# Altium footprint library mobinbyn-Capacitor.PcbLib: 152 footprints (part 6 of 10)
Each footprint in its own frame and in the unit in brackets; x right, y up, seen from the top. Pads: shape width x height; smd on the part's side, far side on the other; paste and mask are expansions set on the pad; w line width, h text height; cw(c..) or ccw(c..) is an arc to the next point about the centre after c.
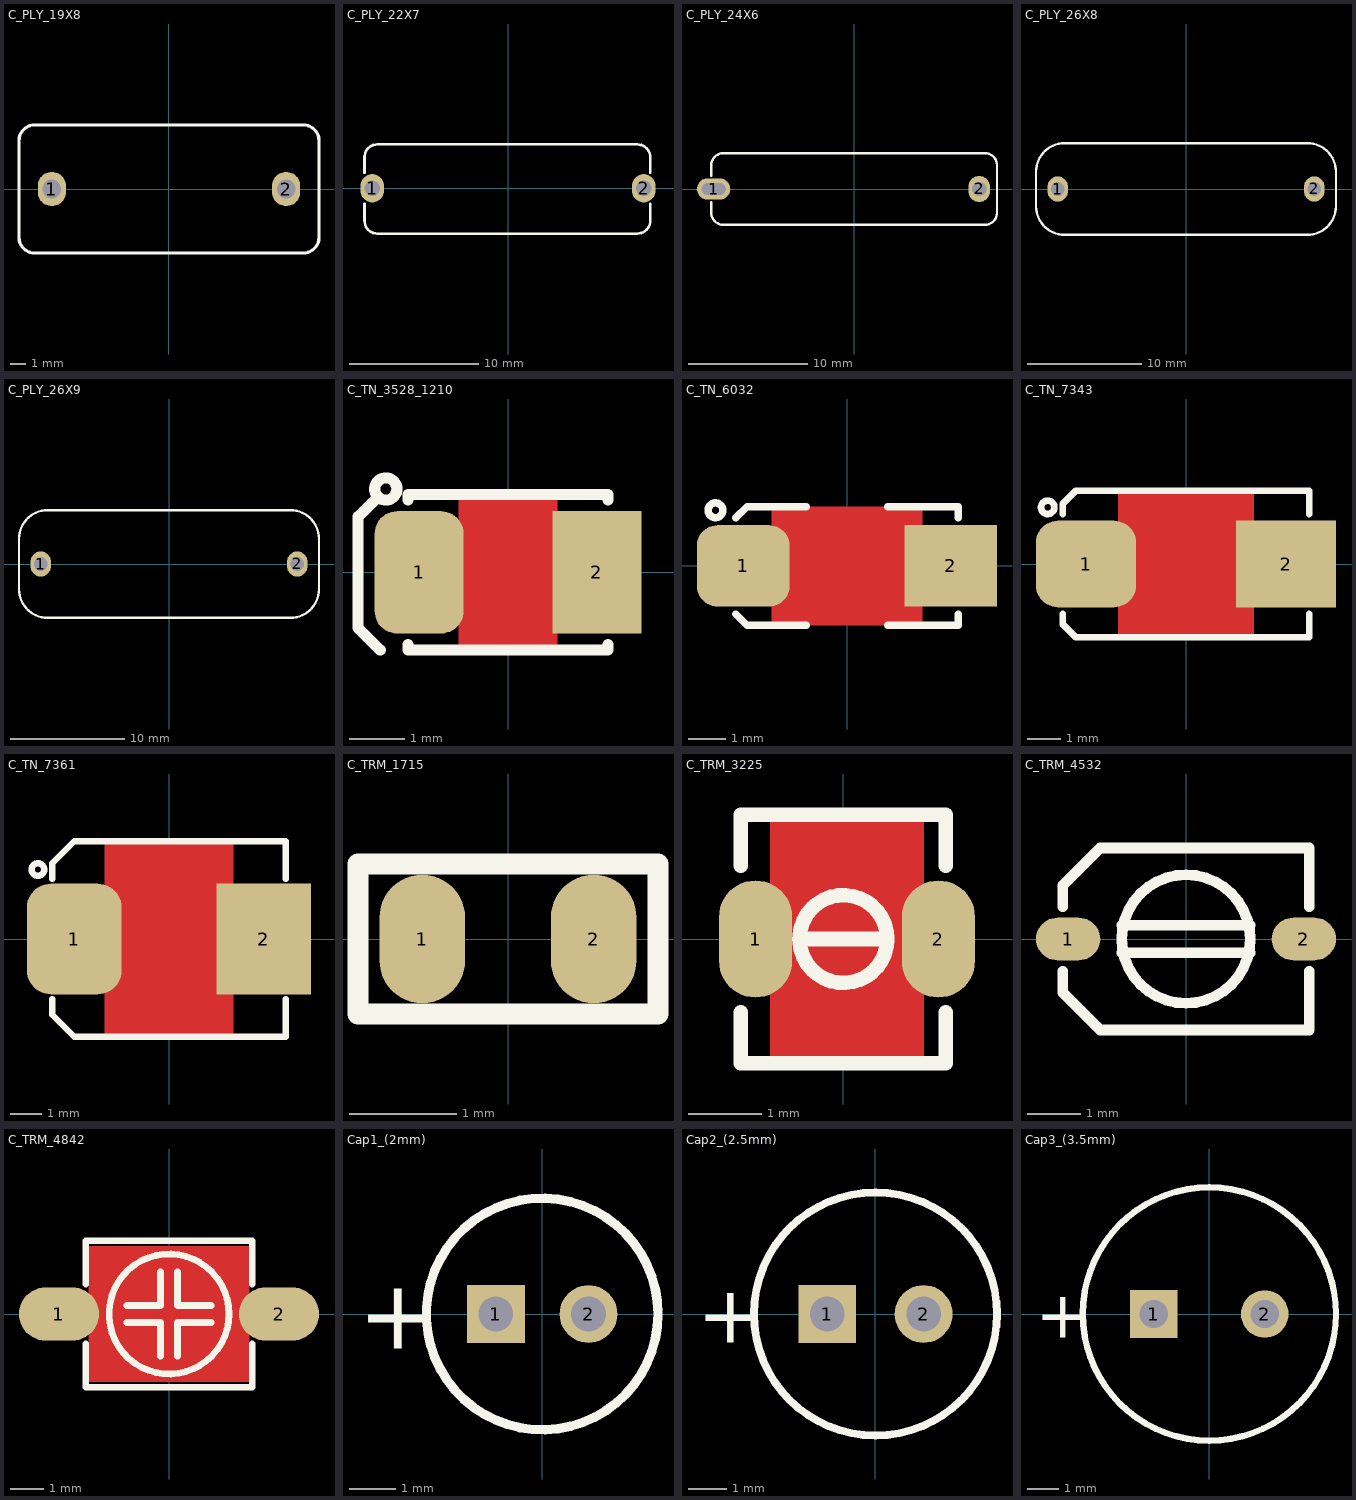
[diagram p5: the footprints below, top view; thin cyan lines are the x and y axes]

## C_PLY_19X8 [mm] "CAP, POLYESTER, 19.0X8.0mm pitch: 15.0mm, 0.22uF 400V"
pads (2):
  oval 1.8x2.2 hole 1.2: 1(-7.5,0) 2(7.5,0)
Top Overlay:
  lines w0.2: -9.6,-3.1 ccw(c-8.6,-3.1) -8.6,-4.1 8.6,-4.1 ccw(c8.6,-3.1) 9.6,-3.1 9.6,3.1 ccw(c8.6,3.1) 8.6,4.1 -8.6,4.1 ccw(c-8.6,3.1) -9.6,3.1 -9.6,-3.1
3D body "User Library-CAP_POLY_15mm.step": height 16, standoff -4, extent -9.5,-4 9.5,4

## C_PLY_22X7 [mm] "CAP, POLYESTER, 33.0X7.0mm pitch: 20.0mm, 0.68uF 400V"
pads (2):
  oval 1.8x2.2 hole 1.2: 1(-10.5,0) 2(10.5,0)
Top Overlay:
  lines w0.2: -11.1,-1.2 -11.1,-2.5 ccw(c-10.1,-2.5) -10.1,-3.5 10,-3.5 ccw(c10,-2.5) 11,-2.5 11,-1.2 ; -11.1,1.2 -11.1,2.5 ; -11.1,2.4 cw(c-10.1,2.4) -10.1,3.4 10,3.4 cw(c10,2.4) 11,2.4 ; 11,1.2 11,2.5
3D body "User Library-ECQE(F) 0_33uf 630Vdc 250Vac.step": height 19, standoff -3, extent -13,-3.9 13,3.9

## C_PLY_24X6 [mm] "CAP, POLYESTER, 23.8X5.8mm pitch: 20.0mm, 0.33uF 400V"
pads (2):
  oval 2.8x1.8 hole 1 slot 2 at 0 deg: 1(-11.8,0)
  oval 1.8x2.2 hole 1.2: 2(10.5,0)
Top Overlay:
  lines w0.2: -12,-2.1 -12,-1.1 ; -12,-2 ccw(c-11,-2) -11,-3 11,-3 ccw(c11,-2) 12,-2 12,2.1 ; -12,1.1 -12,2.1 ; -12,2 cw(c-11,2) -11,3 11,3 cw(c11,2) 12,2
3D body "Cap 330n - 400V Poly_2009.STEP": height 10.92, standoff -3, extent -11.888,-2.85 11.862,2.901

## C_PLY_26X8 [mm] "CAP, POLYESTER, 26.0X7.8mm pitch: 20.0mm, 0.68uF 400V"
pads (2):
  oval 1.8x2.2 hole 1.2: 1(-11.2,0) 2(11.2,0)
Top Overlay:
  lines w0.2: -13.1,-1.5 ccw(c-10.6,-1.5) -10.6,-4 10.6,-4 ccw(c10.6,-1.5) 13.1,-1.5 13.1,1.5 ccw(c10.6,1.5) 10.6,4 -10.6,4 ccw(c-10.6,1.5) -13.1,1.5 -13.1,-1.5
3D body "User Library-ECQE(F) 0_33uf 630Vdc 250Vac.step": height 19, standoff -3, extent -13,-3.9 13,3.9

## C_PLY_26X9 [mm] "CAP, POLYESTER, 26.0X9.3mm pitch: 20.0mm, 0.68uF 400V"
pads (2):
  oval 1.8x2.2 hole 1.2: 1(-11.2,0) 2(11.2,0)
Top Overlay:
  lines w0.2: -13.1,-2.2 ccw(c-10.6,-2.2) -10.6,-4.7 10.6,-4.7 ccw(c10.6,-2.2) 13.1,-2.2 13.1,2.2 ccw(c10.6,2.2) 10.6,4.7 -10.6,4.7 ccw(c-10.6,2.2) -13.1,2.2 -13.1,-2.2
3D body "SW3dPS-ECQE(F) 0.47uf 630Vdc 250Vac.STEP": height 3, standoff -20.5, extent -13,-4.65 13,4.65

## C_TN_3528_1210 [mm] "CAPACITOR, TAN B, TAN H, TAN T, TAN M, 3528P, 1210P, 3.5X2.8mm"
pads (2):
  rrect50% 1.6x2.2 smd mask+0.1: 1(-1.6,0)
  rect 1.6x2.2 smd mask+0.1: 2(1.6,0)
Top Layer:
  pour cut-out: -0.889,1.4 -0.889,-1.4 0.889,-1.4 0.889,1.4
Top Overlay:
  circle w0.2: c-2.2,1.5 r0.2
  lines w0.2: -2.35,1.35 -2.7,1 -2.7,-1 -2.3,-1.4 ; -1.8,-1.3 -1.8,-1.4 1.8,-1.4 1.8,-1.3 ; -1.8,1.3 -1.8,1.4 1.8,1.4 1.8,1.3
3D body "User Library-AVX_BCASE.step": height 2.03, standoff 0, extent -1.85,-1.465 1.85,1.465

## C_TN_6032 [mm] "CAPACITOR, TAN C, TAN F, TAN U, TAN L, 6032P, 6.0X3.2mm"
height 2.8
pads (2):
  rrect50% 2.5x2.2 smd: 1(-2.8,0)
  rect 2.5x2.2 smd: 2(2.8,0)
Top Layer:
  pour cut-out: -2.032,1.6 2.032,1.6 2.032,-1.6 -2.032,-1.6
Top Overlay:
  circle w0.2: c-3.55,1.5 r0.2
  lines w0.2: -3,-1.3 -2.7,-1.6 -1.1,-1.6 ; -3,1.3 -2.7,1.6 -1.1,1.6 ; 1.1,-1.6 3,-1.6 3,-1.3 ; 1.1,1.6 3,1.6 3,1.3
3D body "User Library-CAP_TANT_6032-28_y.step": height 2.8, standoff 0, extent -3.15,-1.75 3.15,1.75

## C_TN_7343 [mm] "CAPACITOR, TAN D, TAN E, TAN Y, TAN X, 7343P, 7.3X4.3mm"
height 4.3
pads (2):
  rrect50% 3x2.6 smd: 1(-3,0)
  rect 3x2.6 smd: 2(3,0)
Top Layer:
  pour cut-out: -2.032,2.2 -2.032,-2.2 2.032,-2.2 2.032,2.2
Top Overlay:
  circle w0.2: c-4.15,1.7 r0.2
  lines w0.2: -3.7,-1.5 -3.7,-1.8 -3.3,-2.2 3.7,-2.2 3.7,-1.5 ; -3.7,1.5 -3.7,1.8 -3.3,2.2 3.7,2.2 3.7,1.5
3D body "User Library-AVX_E_CASE.step": height 4.2, standoff 0, extent -3.7,-2.225 3.7,2.225

## C_TN_7361 [mm] "CAPACITOR, TAN V, 2924, 7361, 7.3X6.1mm"
pads (2):
  rrect50% 3x3.5 smd: 1(-3,0)
  rect 3x3.5 smd: 2(3,0)
Top Layer:
  pour cut-out: -2.032,3.048 -2.032,-3.048 2.032,-3.048 2.032,3.048
Top Overlay:
  circle w0.2: c-4.15,2.2 r0.2
  lines w0.2: -3.7,-1.9 -3.7,-2.4 -3,-3.1 3.7,-3.1 3.7,-1.9 ; -3.7,1.9 -3.7,2.4 -3,3.1 3.7,3.1 3.7,1.9
3D body "User Library-CT_V.step": height 3.45, standoff 0, extent -3.65,-3.05 3.65,3.05

## C_TRM_1715 [mm] "Cap, Trimmer TZR1 1.7mmX1.5mm"
pads (2):
  oval 0.8x1.2 smd mask+0.075: 1(-0.8,0) 2(0.8,0)
Top Overlay:
  lines w0.2: -1.4,-0.7 -1.4,0.7 1.4,0.7 1.4,-0.7 -1.4,-0.7
3D body "User Library-TZR1.STEP": height 1, standoff -0.01, extent -0.864,-0.75 0.85,0.75

## C_TRM_3225 [mm] "Cap, Trimmer TZY2 3.2mmX2.5mm"
pads (2):
  oval 1x1.6 smd: 1(-1.2,0) 2(1.3,0)
Top Layer:
  pour cut-out: -1,1.7 1.1,1.7 1.1,-1.6 -1,-1.6
Top Overlay:
  circle w0.2: c0,0 r0.6
  lines w0.2: -1.4,-1 -1.4,-1.7 1.4,-1.7 1.4,-1 ; -1.4,1 -1.4,1.7 1.4,1.7 1.4,1 ; -0.6,0 0.6,0
3D body "User Library-tzy2seriestrimcap.step": height 1.24, standoff -0.01, extent -1.25,-1.6 1.25,1.6

## C_TRM_4532 [mm] "Cap, Trimmer TZC3 4.5X3.2mm"
pads (2):
  oval 1.2x0.8 smd: 1(-2.2,0) 2(2.2,0)
Top Overlay:
  circle w0.2: c0,0 r1.2
  lines w0.2: -2.3,-0.6 -2.3,-1 -1.6,-1.7 2.3,-1.7 2.3,-0.6 ; -2.3,0.6 -2.3,1 -1.6,1.7 2.3,1.7 2.3,0.6 ; -1.2,-0.254 1.2,-0.254 ; -1.2,0.254 1.2,0.254
3D body "User Library-TZC3P300A110R00.STEP": height 1.6, standoff 0, extent -2.25,-1.6 2.25,1.6

## C_TRM_4842 [mm] "Cap, Trimmer SMD 4.8x4.2mm"
pads (2):
  oval 2.4x1.6 smd: 1(-3.3,0) 2(3.3,0)
Top Layer:
  pour cut-out: -2.413,2.032 2.413,2.032 2.413,-2.032 -2.413,-2.032
Top Overlay:
  circle w0.2: c0,0 r1.8
  lines w0.2: -2.5,-0.9 -2.5,-2.2 2.5,-2.2 2.5,-0.9 ; -2.5,0.9 -2.5,2.2 2.5,2.2 2.5,0.9 ; -1.27,-0.254 -0.254,-0.254 -0.254,-1.27 ; -1.27,0.254 -0.254,0.254 -0.254,1.27 ; 0.254,-1.27 0.254,-0.254 1.27,-0.254 ; 0.254,1.27 0.254,0.254 1.27,0.254
3D body "User Library-trimmer.step": height 3.25, standoff 0, extent -3.523,-2.1 3.523,2.1

## Cap1_(2mm) [mm] "Capacitor, Electrolytic, Radial; Body 5 x 6.8 mm (Dia.xH typ); Pin Spacing 2 mm (typ)"
height 7.8
pads (2):
  rect 1.25x1.25 hole 0.75: 1(-1,0)
  round 1.25 hole 0.75: 2(1,0)
Top Overlay:
  circle w0.2: c0,0 r2.5
  text "+" at -3.975,-0.75 h1.5
3D body "User Library-Cap-EL(5x11-2)T.STEP": height 11, standoff -2.8, extent -2.5,-2.498 2.502,2.498

## Cap2_(2.5mm) [mm] "Capacitor, Electrolytic, Radial; Body 6.3 x 6.8 mm (Dia.xH typ); Pin Spacing 2.5 mm (typ)"
height 7.8
pads (2):
  rect 1.5x1.5 hole 0.9: 1(-1.25,0)
  round 1.5 hole 0.9: 2(1.25,0)
Top Overlay:
  circle w0.2: c0,0 r3.15
  text "+" at -4.625,-0.75 h1.5
3D body "User Library-Cap-EL(6_3x12-2_5).STEP": height 12, standoff -3.2, extent -3.15,-3.149 3.152,3.149

## Cap3_(3.5mm) [mm] "Capacitor, Electrolytic, Radial; Body 8 x 5 mm (Dia.xH typ); Pin Spacing 3.5 mm (typ)"
height 6
pads (2):
  rect 1.5x1.51 hole 0.9: 1(-1.75,0)
  round 1.5 hole 0.9: 2(1.75,0)
Top Overlay:
  circle w0.2: c0,0 r4
  text "+" at -5.475,-0.75 h1.5
3D body "User Library-Cap-EL(8x11_5-3_5).STEP": height 11.5, standoff -3.3, extent -4,-3.998 4.002,3.998